# Altium footprint library DrPCB.PcbLib: 910 footprints (part 6 of 57)
Each footprint in its own frame and in the unit in brackets; x right, y up, seen from the top. Pads: shape width x height; smd on the part's side, far side on the other; paste and mask are expansions set on the pad; w line width, h text height; cw(c..) or ccw(c..) is an arc to the next point about the centre after c.
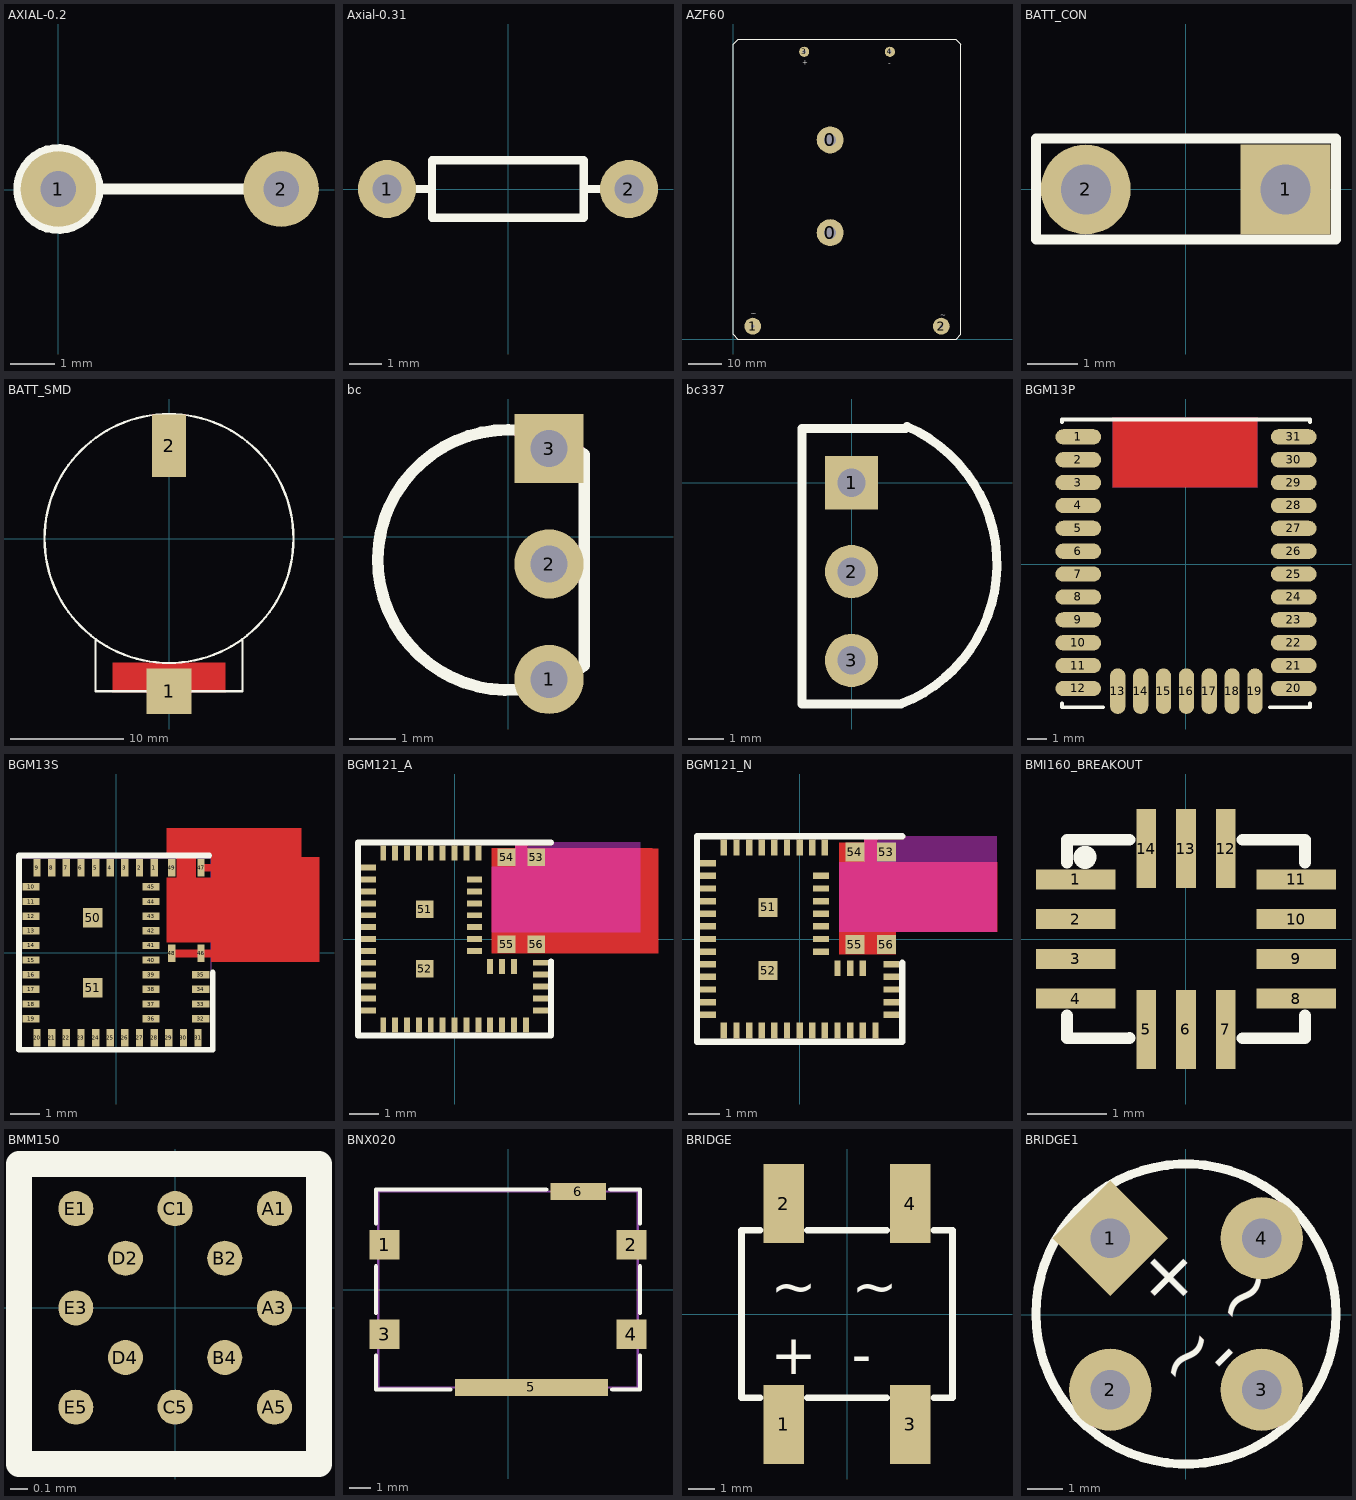
[diagram p5: the footprints below, top view; thin cyan lines are the x and y axes]

## AXIAL-0.2 [mm]
pads (2):
  round 1.7 hole 0.8: 1(0.004,0.016) 2(5.008,0.016)
Top Overlay:
  circle w0.254: c0.004,0.016 r0.884
  lines w0.254: 0.83,0.016 5.008,0.016

## Axial-0.31 [mm]
pads (2):
  round 1.8 hole 0.9: 1(-3.75,0) 2(3.75,0)
Top Overlay:
  lines w0.254: -2.861,0 -2.353,0 ; 2.854,0 2.346,0 ; -2.353,0 -2.353,-0.889 2.346,-0.889 2.346,0 ; -2.353,0 -2.353,0.889 2.346,0.889 2.346,0
3D body "User Library-R-Axial-0_25W-7_62.step": height 2.5, standoff -3.7, extent -4.113,-1.203 4.107,1.203

## AZF60 [mm]
pads (6):
  round 8 hole 3.6: 0(28.75,31.5) 0(28.75,59)
  round 5 hole 1.1: 1(5.81,3.8) 2(61.69,3.8)
  round 3 hole 1.1: 3(21.05,85.1) 4(46.45,85.1)
Top Overlay:
  lines w0.254: -0.019,87.382 0.012,87.382 1.513,88.883 ; -0.001,87.382 -0.001,1.409 1.408,0 66.127,0 67.5,1.373 67.5,87.324 65.932,88.892 ; 1.519,88.889 65.932,88.889
  text "-" at 46.009,81.167 h1.52
  text "+" at 20.543,81.242 h1.52
  text "~" at 5.177,6.825 h1.52
  text "~" at 61.325,6.445 h1.52

## BATT_CON [mm]
pads (2):
  rect 1.8x1.8 hole 1: 1(2,0)
  round 1.8 hole 1: 2(-2,0)
Top Overlay:
  lines w0.2: -2.997,-1.003 -2.997,1.016 3.01,1.016 3.01,-1.003 -2.997,-1.003

## BATT_SMD [mm]
pads (2):
  rect 4x4 smd: 1(0,-13.5)
  rect 3x5.5 smd: 2(0,8.204)
Top Layer:
  rectangle: -5,-13.6 5,-10.935
Top Overlay:
  circle w0.2: c0,0 r11
  lines w0.2: -6.5,-8.877 -6.5,-13.5 6.5,-13.5 6.5,-8.877

## bc [mm]
pads (3):
  round 1.5 hole 0.8: 1(0.889,-3.095) 2(0.889,-0.595)
  rect 1.5x1.5 hole 0.8: 3(0.889,1.905)
Top Overlay:
  lines w0.254: 1.589,-2.838 cw(c0,-0.508) 1.651,1.778 1.651,-2.794

## bc337 [mm]
pads (3):
  rect 1.5x1.5 hole 0.8: 1(0,0)
  round 1.5 hole 0.8: 2(0,-2.5) 3(0,-5)
Top Overlay:
  lines w0.254: 1.524,1.524 -1.397,1.524 -1.397,-6.223 1.397,-6.223 ccw(c-0.127,-2.286) 1.565,1.582

## BGM13P [mm]
pads (31):
  rrect100% 2.4x0.8 smd paste+0 mask+0: 1(-5.65,6.67) 2(-5.65,5.47) 3(-5.65,4.27) 4(-5.65,3.07) 5(-5.65,1.87) 6(-5.65,0.67) 7(-5.65,-0.53) 8(-5.65,-1.73) 9(-5.65,-2.93) 10(-5.65,-4.13) 11(-5.65,-5.33) 12(-5.65,-6.53) 20(5.65,-6.53) 21(5.65,-5.33) 22(5.65,-4.13) 23(5.65,-2.93) 24(5.65,-1.73) 25(5.65,-0.53) 26(5.65,0.67) 27(5.65,1.87) 28(5.65,3.07) 29(5.65,4.27) 30(5.65,5.47) 31(5.65,6.67)
  rrect100% 0.8x2.4 smd paste+0 mask+0: 13(-3.58,-6.67) 14(-2.38,-6.67) 15(-1.18,-6.67) 16(0.02,-6.67) 17(1.22,-6.67) 18(2.42,-6.67) 19(3.62,-6.67)
Top Layer:
  pour cut-out: -3.848,7.671 -3.848,4.039 3.746,4.039 3.746,7.671
Bottom Layer:
  pour cut-out: -3.848,7.671 -3.848,4.039 3.746,4.039 3.746,7.671
Top Overlay:
  lines w0.2: -6.5,-7.305 -6.5,-7.52 -4.355,-7.52 ; -6.5,7.445 -6.5,7.58 6.5,7.58 6.5,7.445 ; 4.395,-7.52 6.5,-7.52 6.5,-7.305
3D body "UNK_Silicon_Labs_BGM13P32F512GA-V2_eec.STEP": height 2.1, standoff 0, extent -6.45,-7.5 6.45,7.5

## BGM13S [mm]
pads (51):
  rect 0.25x0.59 smd paste-0.5 mask+0.065: 1(1.303,2.905) 2(0.803,2.905) 3(0.303,2.905) 4(-0.197,2.905) 5(-0.697,2.905) 6(-1.197,2.905) 7(-1.697,2.905) 8(-2.197,2.905) 9(-2.697,2.905) 20(-2.697,-2.905) 21(-2.197,-2.905) 22(-1.697,-2.905) 23(-1.197,-2.905) 24(-0.697,-2.905) 25(-0.197,-2.905) 26(0.303,-2.905) 27(0.803,-2.905) 28(1.303,-2.905) 29(1.803,-2.905) 30(2.303,-2.905) 31(2.803,-2.905) 46(2.903,-0.015) 47(2.903,2.905) 48(1.903,-0.015) 49(1.903,2.905)
  rect 0.59x0.25 smd paste-0.5 mask+0.065: 10(-2.902,2.25) 11(-2.902,1.75) 12(-2.902,1.25) 13(-2.902,0.75) 14(-2.902,0.25) 15(-2.902,-0.25) 16(-2.902,-0.75) 17(-2.902,-1.25) 18(-2.902,-1.75) 19(-2.902,-2.25) 32(2.898,-2.25) 33(2.898,-1.75) 34(2.898,-1.25) 35(2.898,-0.75) 36(1.198,-2.25) 37(1.198,-1.75) 38(1.198,-1.25) 39(1.198,-0.75) 40(1.198,-0.25) 41(1.198,0.25) 42(1.198,0.75) 43(1.198,1.25) 44(1.198,1.75) 45(1.198,2.25)
  rect 0.67x0.67 smd paste-0.055 mask+0.065: 50(-0.797,1.2) 51(-0.797,-1.2)
Top Layer:
  region: 3.253,3.255 3.253,3.03 2.853,3.03 2.853,2.78 3.253,2.78 3.253,2.555 6.743,2.555 6.743,3.255
  region: 6.333,3.255 6.333,-0.315 6.933,-0.315 6.933,3.255
  pour cut-out: 1.733,0.355 1.733,2.555 2.077,2.555 2.077,3.255 1.733,3.255 1.732,4.255 6.332,4.255 6.333,3.255 2.723,3.255 2.722,2.555 6.732,2.555 6.732,0.355
  region: 3.253,0.355 3.253,0.105 1.823,0.105 1.823,-0.145 3.252,-0.145 3.252,-0.315 6.742,-0.315 6.743,0.355
Top Overlay:
  lines w0.2: 3.187,3.326 -3.314,3.326 -3.314,-3.315 3.302,-3.315 3.302,-0.674
Top Paste:
  lines w0.25: -3.011,-2.25 -2.793,-2.25 ; -3.011,-1.75 -2.793,-1.75 ; -3.011,-1.25 -2.793,-1.25 ; -3.011,-0.75 -2.793,-0.75 ; -3.011,-0.25 -2.793,-0.25 ; -3.011,0.25 -2.793,0.25 ; -3.011,0.75 -2.793,0.75 ; -3.011,1.25 -2.793,1.25 ; -3.011,1.75 -2.793,1.75 ; -3.011,2.25 -2.793,2.25 ; -2.697,-3.014 -2.697,-2.796 ; -2.697,2.796 -2.697,3.014 ; -2.197,-3.014 -2.197,-2.796 ; -2.197,2.796 -2.197,3.014 ; -1.697,-3.014 -1.697,-2.796 ; -1.697,2.796 -1.697,3.014 ; -1.197,-3.014 -1.197,-2.796 ; -1.197,2.796 -1.197,3.014 ; -0.697,-3.014 -0.697,-2.796 ; -0.697,2.796 -0.697,3.014 ; -0.197,-3.014 -0.197,-2.796 ; -0.197,2.796 -0.197,3.014 ; 0.303,-3.014 0.303,-2.796 ; 0.303,2.796 0.303,3.014 ; 0.803,-3.014 0.803,-2.796 ; 0.803,2.796 0.803,3.014 ; 1.089,-2.25 1.306,-2.25 ; 1.089,-1.75 1.306,-1.75 ; 1.089,-1.25 1.306,-1.25 ; 1.089,-0.75 1.306,-0.75 ; 1.089,-0.25 1.306,-0.25 ; 1.089,0.25 1.306,0.25 ; 1.089,0.75 1.306,0.75 ; 1.089,1.25 1.306,1.25 ; 1.089,1.75 1.306,1.75 ; 1.089,2.25 1.306,2.25 ; 1.303,-3.014 1.303,-2.796 ; 1.303,2.796 1.303,3.014 ; 1.803,-3.014 1.803,-2.796 ; 1.903,-0.124 1.903,0.094 ; 1.903,2.797 1.903,3.013 ; 2.303,-3.014 2.303,-2.796 ; 2.789,-2.25 3.006,-2.25 ; 2.789,-1.75 3.006,-1.75 ; 2.789,-1.25 3.006,-1.25 ; 2.789,-0.75 3.006,-0.75 ; 2.803,-3.014 2.803,-2.796 ; 2.903,-0.124 2.903,0.094 ; 2.903,2.796 2.903,3.014
Mechanical 16:
  lines w0.025: -3.252,-3.25 -3.252,3.25 3.248,3.25 3.248,-3.25 -3.252,-3.25
Multi-Layer:
  pour cut-out: 6.332,4.255 6.332,0.355 1.732,0.355 1.732,2.465 1.732,4.255
3D body "BGM13S32F512GN-V2--3DModel-STEP-56544.STEP": height 1.41, standoff 0.01, extent -3.25,-3.25 3.25,3.25

## BGM121_A [mm]
pads (56):
  rect 0.2x0.5 smd mask+0.015: 1(0.8,2.9) 2(0.4,2.9) 3(0,2.9) 4(-0.4,2.9) 5(-0.8,2.9) 6(-1.2,2.9) 7(-1.6,2.9) 8(-2,2.9) 9(-2.4,2.9) 23(-2.4,-2.9) 24(-2,-2.9) 25(-1.6,-2.9) 26(-1.2,-2.9) 27(-0.8,-2.9) 28(-0.4,-2.9) 29(0,-2.9) 30(0.4,-2.9) 31(0.8,-2.9) 32(1.2,-2.9) 33(1.6,-2.9) 34(2,-2.9) 35(2.4,-2.9) 41(2,-0.925) 42(1.6,-0.925) 43(1.2,-0.925)
  rect 0.5x0.2 smd mask+0.015: 10(-2.9,2.4) 11(-2.9,2) 12(-2.9,1.6) 13(-2.9,1.2) 14(-2.9,0.8) 15(-2.9,0.4) 16(-2.9,0) 17(-2.9,-0.4) 18(-2.9,-0.8) 19(-2.9,-1.2) 20(-2.9,-1.6) 21(-2.9,-2) 22(-2.9,-2.4) 36(2.9,-2.4) 37(2.9,-2) 38(2.9,-1.6) 39(2.9,-1.2) 40(2.9,-0.8) 44(0.675,-0.4) 45(0.675,0) 46(0.675,0.4) 47(0.675,0.8) 48(0.675,1.2) 49(0.675,1.6) 50(0.675,2)
  rect 0.6x0.6 smd mask+0.015: 51(-1,1) 52(-1,-1) 53(2.75,2.75) 54(1.75,2.75) 55(1.75,-0.175) 56(2.75,-0.175)
Top Layer:
  region: 2.05,3.05 1.25,3.05 1.25,2.425 2.05,2.425
  region: 3.05,0.225 1.25,0.225 1.25,-0.475 3.05,-0.475
  pour cut-out: 1.25,0.225 1.25,2.425 2.05,2.425 2.05,3.25 2.45,3.25 2.45,2.425 6.25,2.425 6.25,0.225
  region: 2.45,3.05 2.45,2.425 6.65,2.425 6.65,3.05
  region: 6.25,3.045 6.25,-0.475 6.85,-0.475 6.85,3.045
  region: 2.45,0.225 2.45,-0.475 6.65,-0.475 6.65,0.225
Top Overlay:
  lines w0.2: 3.25,-0.75 3.25,-3.25 -3.25,-3.25 -3.25,3.25 3.25,3.25
Keep-Out Layer:
  pour cut-out: 6.25,3.25 6.25,0.225 1.25,0.225 1.25,2.425 2.05,2.425 2.05,3.25 2.45,3.25

## BGM121_N [mm]
pads (56):
  rect 0.2x0.5 smd mask+0.015: 1(0.8,2.9) 2(0.4,2.9) 3(0,2.9) 4(-0.4,2.9) 5(-0.8,2.9) 6(-1.2,2.9) 7(-1.6,2.9) 8(-2,2.9) 9(-2.4,2.9) 23(-2.4,-2.9) 24(-2,-2.9) 25(-1.6,-2.9) 26(-1.2,-2.9) 27(-0.8,-2.9) 28(-0.4,-2.9) 29(0,-2.9) 30(0.4,-2.9) 31(0.8,-2.9) 32(1.2,-2.9) 33(1.6,-2.9) 34(2,-2.9) 35(2.4,-2.9) 41(2,-0.925) 42(1.6,-0.925) 43(1.2,-0.925)
  rect 0.5x0.2 smd mask+0.015: 10(-2.9,2.4) 11(-2.9,2) 12(-2.9,1.6) 13(-2.9,1.2) 14(-2.9,0.8) 15(-2.9,0.4) 16(-2.9,0) 17(-2.9,-0.4) 18(-2.9,-0.8) 19(-2.9,-1.2) 20(-2.9,-1.6) 21(-2.9,-2) 22(-2.9,-2.4) 36(2.9,-2.4) 37(2.9,-2) 38(2.9,-1.6) 39(2.9,-1.2) 40(2.9,-0.8) 44(0.675,-0.4) 45(0.675,0) 46(0.675,0.4) 47(0.675,0.8) 48(0.675,1.2) 49(0.675,1.6) 50(0.675,2)
  rect 0.6x0.6 smd mask+0.015: 51(-1,1) 52(-1,-1) 53(2.75,2.75) 54(1.75,2.75) 55(1.75,-0.175) 56(2.75,-0.175)
Top Layer:
  pour cut-out: 1.25,0.225 1.25,2.425 2.05,2.425 2.05,3.25 2.45,3.25 2.45,2.425 6.25,2.425 6.25,0.225
  region: 3.05,0.225 1.25,0.225 1.25,-0.475 3.05,-0.475
  region: 2.05,3.05 1.25,3.05 1.25,2.425 2.05,2.425
Top Overlay:
  lines w0.2: 3.25,-0.75 3.25,-3.25 -3.25,-3.25 -3.25,3.25 3.25,3.25
Keep-Out Layer:
  pour cut-out: 6.25,3.25 6.25,0.225 1.25,0.225 1.25,2.425 2.05,2.425 2.05,3.25 2.45,3.25

## BMI160_BREAKOUT [mm]
pads (14):
  rect 1x0.25 smd: 1(-1.389,0.75) 2(-1.389,0.25) 3(-1.389,-0.25) 4(-1.389,-0.75) 8(1.389,-0.75) 9(1.389,-0.25) 10(1.389,0.25) 11(1.389,0.75)
  rect 0.25x1 smd: 5(-0.5,-1.139) 6(0,-1.139) 7(0.5,-1.139) 12(0.5,1.139) 13(0,1.139) 14(-0.5,1.139)
Top Overlay:
  lines w0.15: -1.5,-0.965 -1.5,-1.25 -0.711,-1.245 ; -1.5,0.965 -1.5,1.25 -0.711,1.25 ; 0.711,-1.25 1.498,-1.25 1.498,-0.965 ; 0.711,1.25 1.5,1.25 1.5,0.965
  lines w0.254: -1.258,1.016 cw(c-1.27,1.029) -1.252,1.029

## BMM150 [mm]
pads (12):
  round 0.2 smd mask+0.05: A1(0.566,0.566) A3(0.566,0) A5(0.566,-0.566) B2(0.283,0.283) B4(0.283,-0.283) C1(0,0.566) C5(0,-0.566) D2(-0.283,0.283) D4(-0.283,-0.283) E1(-0.566,0.566) E3(-0.566,0) E5(-0.566,-0.566)
Top Overlay:
  lines w0.15: -0.89,-0.89 -0.89,0.82 0.82,0.82 0.82,-0.89 -0.89,-0.89
3D body "User Library-bmm150.step": height 0.4, standoff -0.2, extent -0.815,-0.815 0.745,0.745

## BNX020 [mm] "MURATA EMIFIL SMD BNX023-01, BNX022"
height 3.1
pads (6):
  rect 1.4x1.4 smd mask+0.1: 1(-5.8,2.1) 2(5.8,2.1) 3(-5.8,-2.1) 4(5.8,-2.1)
  rect 7.2x0.8 smd: 5(1.1,-4.6)
  rect 2.6x0.8 smd: 6(3.3,4.6)
Top Overlay:
  lines w0.2: -6.2,-3.1 -6.2,-4.7 -2.7,-4.7 ; -6.2,-1.1 -6.2,1.1 ; -6.2,3.1 -6.2,4.7 1.8,4.7 ; 4.8,4.7 6.2,4.7 6.2,3.1 ; 4.9,-4.7 6.2,-4.7 6.2,-3.1 ; 6.2,-1.1 6.2,1.1
Mechanical 13:
  lines w0.1: -6.1,-4.6 6.1,-4.6 6.1,4.6 -6.1,4.6 -6.1,-4.6
3D body "User Library-BNX022.step": height 3.1, standoff 0, extent -6.05,-4.55 6.05,4.55

## BRIDGE [mm]
pads (4):
  rect 1.524x3 smd: 1(-2.4,-4.191) 2(-2.4,4.191) 3(2.4,-4.191) 4(2.4,4.191)
Top Overlay:
  lines w0.254: -3.302,-3.175 -4,-3.175 -4,3.175 -3.289,3.175 ; -1.511,-3.175 1.511,-3.175 ; -1.511,3.175 1.511,3.175 ; 3.289,-3.175 4,-3.175 4,3.175 3.289,3.175
  text "~  ~" at -2.897,0.318 h1.52
  text "+  -" at -2.897,-2.286 h1.52

## BRIDGE1 [mm]
pads (4):
  rect 2.3x2.3 hole 1.1 rot 45: 1(-2.12,2.136)
  round 2.3 hole 1.1: 2(-2.12,-2.107) 3(2.123,-2.107) 4(2.123,2.136)
Top Overlay:
  circle w0.254: c0.001,0.015 r4.2
  text "+" at -0.624,-0.046 h1.52
  text "-" at 1.215,-1.886 h1.52
  text "~" at -0.109,-2.254 h1.52
  text "~" at 1.491,-0.58 h1.52